# Altium schematic symbol library lib_datalogger.SchLib: 1246 symbols (part 15 of 16) (continued)
## CMP-023-000036-1 (continued)
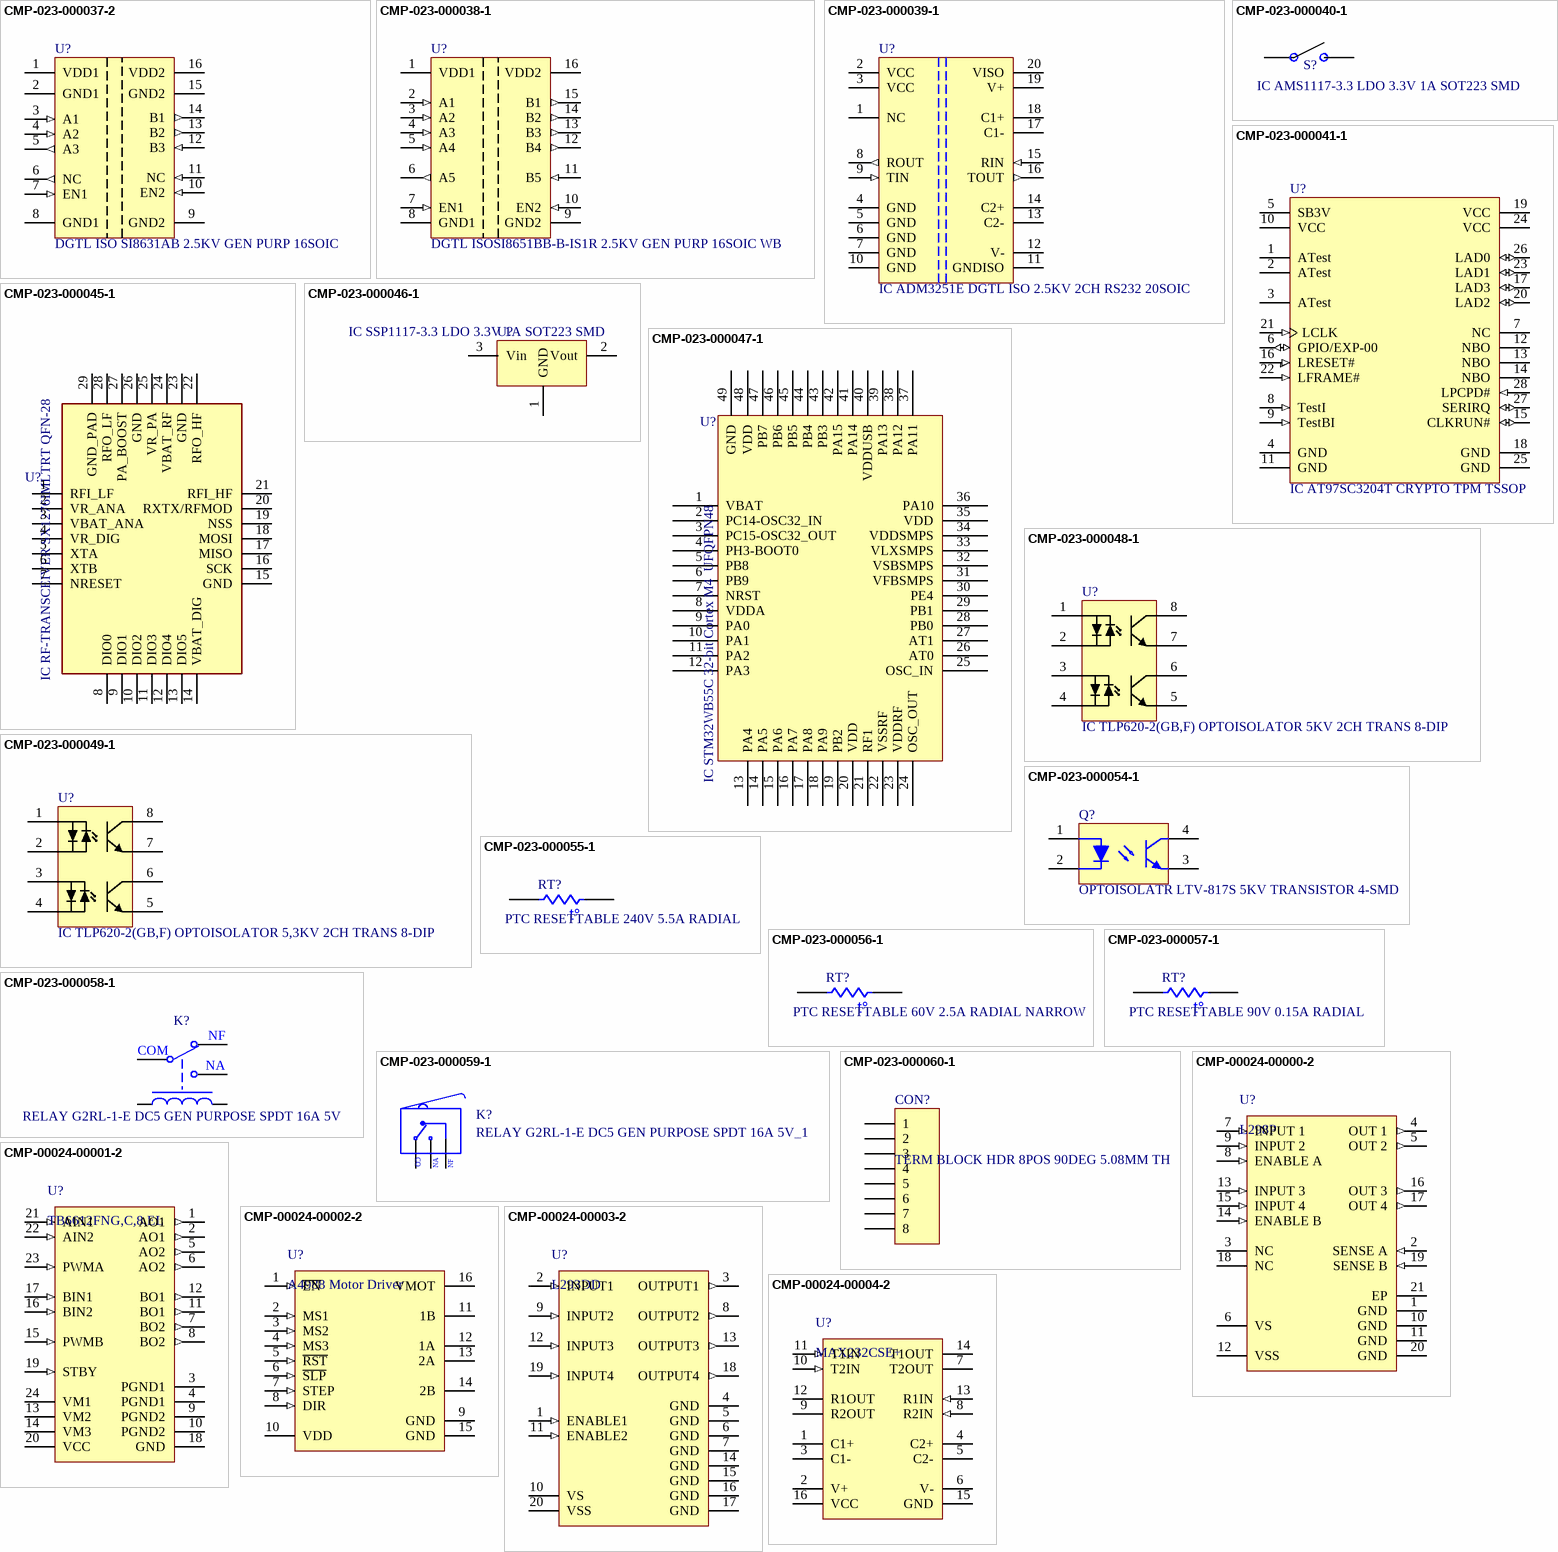
[diagram p42: symbols CMP-023-000037-2 to CMP-00024-00004-2]

## CMP-023-000037-2
designator U?, comment DGTL ISO SI8631AB 2.5KV GEN PURP 16SOIC
DGTL ISO 2.5KV GEN PURP 16SOIC; Manufacturer: Silicon Labs; Manufacturer Part Number: Si8631AB-B-ISR; Max Power Dissipation: 415mW; Number of Channels: 3; Max Supply Voltage: 5.5V; Turn-On Delay Time: 35ns; Min Supply Voltage: 2.5V; Data Rate: 1Mbps; Channel Type: Unidirectional; Operating Supply Current: 2.7mA; Isolated Power: No; Pulse Width Distortion (PWD): 25ns; ComponentLink3URL: https://datasheet.ciiva.com/29659/si86xx-29659215.pdf?src-supplier=Digi-Key; Stock 2: 2970; Min Operating Temperature: -40°C; Source: mits.SchLib; RoHS: Yes; ComponentLink2URL: https://datasheet.ciiva.com/29891/si86xx-29891862.pdf?src-supplier=Avnet; ComponentLink2Description: https://datasheet.ciiva.com/29891/si86xx-29891862.pdf?src-supplier=Avnet; Number of Pins: 16; Stock 1: 2970; ComponentLink1URL: http://www.analog.com/media/en/technical-documentation/data-sheets/ADuM160N-161N-162N-163N.pdf; Category: Integrated Circuits (ICs); ComponentLink4URL: https://datasheet.ciiva.com/29891/si86xx-29891863.pdf?src-supplier=Avnet; Pricing 1: 1=1,49000, 25=1,43360, 100=1,37860 (USD); ComponentLink1Description: http://www.analog.com/media/en/technical-documentation/data-sheets/ADuM160N-161N-162N-163N.pdf; ComponentLink4Description: https://datasheet.ciiva.com/29891/si86xx-29891863.pdf?src-supplier=Avnet; Pricing 2: 1=1,49000, 25=1,43360, 100=1,37860 (USD); Packaging: Tape and Reel; Case/Package: SOIC; Propagation Delay: 35ns; ComponentLink3Description: https://datasheet.ciiva.com/29659/si86xx-29659215.pdf?src-supplier=Digi-Key; Package Quantity: 2500; Max Operating Temperature: 125°C; Type: General Purpose; Design Item ID: DGTL ISO SI8631AB 2.5KV GEN PURP 16SOIC
footprint 16-SOIC(W)
footprint 16-SOIC(W)
pins: 1 VDD1 (power), 2 GND1 (power), 3 A1 (in), 4 A2 (in), 5 A3 (out), 6 NC (out), 7 EN1 (in), 8 GND1 (power), 9 GND2 (power), 10 EN2 (in), 11 NC (in), 12 B3 (in), 13 B2 (out), 14 B1 (out), 15 GND2 (power), 16 VDD2 (power)

## CMP-023-000038-1
designator U?, comment DGTL ISOSI8651BB-B-IS1R 2.5KV GEN PURP 16SOIC WB
Manufacturer: Silicon Labs; Manufacturer Part Number: SI8651BD-B-IS; Data Rate: 1Mbps; Max Power Dissipation: 415mW; Channel Type: Unidirectional; Number of Channels: 3; Propagation Delay: 35ns; Max Supply Voltage: 5.5V; Turn-On Delay Time: 10ns; Nominal Supply Current: 18.4mA; Isolated Power: No; Isolation Voltage: 3.75kV; Pulse Width Distortion (PWD): 25ns; Min Supply Voltage: 2.5V; Operating Supply Current: 2.7mA; Rise Time: 4ns; Max Input Current: 9.2mA; ComponentLink4Description: https://datasheet.ciiva.com/29891/si865x-29891900.pdf?src-supplier=Avnet; Package Quantity: 2500; REACH SVHC: Unknown; ComponentLink7URL: https://datasheet.ciiva.com/46410/1816592-46410007.pdf?src-supplier=Element14; Type: General Purpose; Max Operating Temperature: 125°C; ComponentLink2Description: https://datasheet.ciiva.com/29891/si86xx-29891862.pdf?src-supplier=Avnet; Number of Pins: 16; Length: 9.9mm; ComponentLink6URL: https://datasheet.ciiva.com/2082/supportdocuments2ftechnicaldocs2fsi865x-2082193.pdf?src-supplier=Digi-Key; ComponentLink5URL: https://datasheet.ciiva.com/15273/si865x-15273012.pdf?src-supplier=Arrow+Europe; ComponentLink6Description: https://datasheet.ciiva.com/2082/supportdocuments2ftechnicaldocs2fsi865x-2082193.pdf?src-supplier=Digi-Key; Weight: 0.001764oz; Min Operating Temperature: -40°C; ComponentLink1URL: http://www.analog.com/media/en/technical-documentation/data-sheets/ADuM160N-161N-162N-163N.pdf; ComponentLink2URL: https://datasheet.ciiva.com/29891/si86xx-29891862.pdf?src-supplier=Avnet; ComponentLink4URL: https://datasheet.ciiva.com/29891/si865x-29891900.pdf?src-supplier=Avnet; ComponentLink3URL: https://datasheet.ciiva.com/29659/si86xx-29659215.pdf?src-supplier=Digi-Key; Pricing 2: 1=2,45000, 25=2,36200, 100=2,27130, 1000=2,23742 (USD); Design Item ID: DGTL ISOSI8651BB-B-IS1R 2.5KV GEN PURP 16SOIC WB; Case/Package: SOIC; Source: mits.SchLib; Power Dissipation: 415mW; Packaging: Tape and Reel; Pricing 1: 1=2,45000, 25=2,36200, 100=2,27130, 1000=2,23742 (USD); Depth: 1.25mm; Width: 3.9mm; ComponentLink1Description: http://www.analog.com/media/en/technical-documentation/data-sheets/ADuM160N-161N-162N-163N.pdf; Category: Integrated Circuits (ICs); ComponentLink5Description: https://datasheet.ciiva.com/15273/si865x-15273012.pdf?src-supplier=Arrow+Europe; RoHS: Yes; Stock 2: 4459; Stock 1: 4459; ComponentLink7Description: https://datasheet.ciiva.com/46410/1816592-46410007.pdf?src-supplier=Element14; ComponentLink3Description: https://datasheet.ciiva.com/29659/si86xx-29659215.pdf?src-supplier=Digi-Key
footprint 16-SOIC(W)
footprint 16-SOIC(W)
pins: 1 VDD1 (power), 2 A1 (in), 3 A2 (in), 4 A3 (in), 5 A4 (in), 6 A5 (out), 7 EN1 (in), 8 GND1 (power), 9 GND2 (power), 10 EN2 (in), 11 B5 (in), 12 B4 (out), 13 B3 (out), 14 B2 (out), 15 B1 (out), 16 VDD2 (power)

## CMP-023-000039-1
designator U?, comment IC ADM3251E DGTL ISO 2.5KV 2CH RS232 20SOIC
DGTL ISO 2.5KV 2CH RS232 20SOIC; Part#: ADM3251EARWZ-REEL; Manufacturer: Analog Devices Inc.; MSRP: 4,636; eVendor: Digi-Key; eVendorPrice: 7,48; eVendor#: ADM3251EARWZ-REELCT-ND; MOQ: 500; Design Item ID: IC ADM3251E DGTL ISO 2.5KV 2CH RS232 20SOIC; Source: mits.SchLib; Datasheet: http://www.analog.com/media/en/technical-documentation/data-sheets/ADM3251E.pdf; Obs: -
footprint 20-SOIC WIDE
footprint 20-SOIC WIDE
pins: 1 NC "No Connect. This pin should always remain unconnected.", 2 VCC (power) "Power Supply Input. A 0.1 µF decoupling capacitor is required between VCC and ground. When a voltage", 3 VCC (power) "Power Supply Input. A 0.1 µF decoupling capacitor is required between VCC and ground. When a voltage", 4 GND (power) "Ground.", 5 GND (power) "Ground.", 6 GND (power) "Ground.", 7 GND (power) "Ground.", 8 ROUT (out) "Receiver Output. This pin outputs CMOS logic levels.", 9 TIN (in) "Transmitter (Driver) Input. This pin accepts CMOS levels.", 10 GND (power) "Ground.", 11 GNDISO (power) "Ground Reference for Isolated RS-232 Side.", 12 V- (power) "Internally Generated Negative Supply.", 13 C2- "Negative Connection for Charge Pump Capacitors. External Capacitor C2 is connected between  these pins; a 0.1 µF capacitor is recommended, but larger capacitors up to 10 µF can be used.", 14 C2+ "Positive Connection for Charge Pump Capacitors. External Capacitor C2 is connected between  these pins; a 0.1 µF capacitor is recommended, but larger capacitors up to 10 µF can be used.", 15 RIN (in) "Receiver Input. This input accepts RS-232 signal levels.", 16 TOUT (out) "Transmitter (Driver) Output. This outputs RS-232 signal levels.", 17 C1- "Negative Connection for Charge Pump Capacitors. External Capacitor C1 is connected between  these pins; a 0.1 µF capacitor is recommended, but larger capacitors up to 10 µF can be used.", 18 C1+ "Positive Connection for Charge Pump Capacitors. External Capacitor C1 is connected between  these pins; a 0.1 µF capacitor is recommended, but larger capacitors up to 10 µF can be used.", 19 V+ (power) "Internally Generated Positive Supply.", 20 VISO (power) "Isolated Supply Voltage for Isolator Secondary Side. A 0.1 µF decoupling capacitor is required between VISO  and ground. When the integrated dc-to-dc converter is enabled, the VISO pin should not be used to power  external circuitry. If the integrated dc-to-dc converter is disabled, power the secondary side by applying a  voltage in the range of 3.0 V to 5.5 V to this pin."

## CMP-023-000040-1
designator S?, comment IC AMS1117-3.3 LDO 3.3V 1A SOT223 SMD
FIXED 30V 3.3V 1.4V 1A SOT-223 DROPOUT REGULATORS(LDO) ROHS; Manufacturer 1: Slkor(SLKORMICRO Elec.); Polarity: Positive; Min Input Voltage: 3.8V; Number of Outputs: 1; ComponentLink1Description: https://datasheet.lcsc.com/szlcsc/1912111437_Slkor-SLKORMICRO-Elec-AMS1117-3-3_C426566.pdf; Category: Voltage Regulators - Linear; Max Input Voltage: 30V; Output Current: 1A; Max Output Voltage: 3.3V; Design Item ID: IC AMS1117-3.3 LDO 3.3V 1A SOT223 SMD; Max Output Current: 1A; Min Output Voltage: 3.3V; Case/Package: SOT-223; Number of Pins: 4; Manufacturer Part Number 1: AMS1117-3.3; Min Operating Temperature: 0°C; Packaging: Cut Tape; Output Voltage: 3.3V; RoHS: Yes; Radiation Hardening: No; ComponentLink1URL: https://datasheet.lcsc.com/szlcsc/1912111437_Slkor-SLKORMICRO-Elec-AMS1117-3-3_C426566.pdf; Max Operating Temperature: 125°C; Nominal Output Voltage: 3.3V; Output Type: Fixed; Source: mits.SchLib
footprint SWITCH_TOGGLE_TH
footprint SOT-223
pins: 1, 2

## CMP-023-000041-1
designator U?, comment IC AT97SC3204T CRYPTO TPM TSSOP
Fully Integrated Security Module; Manufacturer Part Number: AT97SC3204T-X2A1B-10; Manufacturer: Microchip / Atmel; Max Frequency: 33MHz; Memory Type: EEPROM; Core Architecture: AVR; Data Bus Width: 8b; Min Supply Voltage: 3V; Interface: I2C,Serial,2-Wire; Max Supply Voltage: 3.6V; Max Operating Temperature: 70°C; Series: CryptoController™; Package Quantity: 50; Case/Package: TSSOP; RoHS Compliant: Yes; Min Operating Temperature: 0°C; Mount: Surface Mount; ComponentLink1Description: https://datasheet.ciiva.com/29646/atmel-5295s-tpm-at97sc3204-lpc-interface-datasheet-summary-29646965.pdf?src-supplier=Digi-Key; Number of Pins: 28; Packaging: Rail/Tube; Category: Microcontrollers; Source: mits.SchLib; Design Item ID: IC AT97SC3204T CRYPTO TPM TSSOP; RoHS: Yes; ComponentLink1URL: https://datasheet.ciiva.com/29646/atmel-5295s-tpm-at97sc3204-lpc-interface-datasheet-summary-29646965.pdf?src-supplier=Digi-Key; Lead Free: Lead Free; Radiation Hardening: No
footprint 28-TSSOP
footprint 28-TSSOP
pins: 1 ATest "Atmel Teste Pin", 2 ATest "Atmel Teste Pin", 3 ATest "Atmel Teste Pin", 4 GND (power) "System Ground", 5 SB3V (power) "Standby 3.3v Supply", 6 GPIO/EXP-00 (io) "GPIO assigned to TPM_NV_INDEX_GPIO_00", 7 NC "No Connect Pins", 8 TestI (in) "Test Input", 9 TestBI (in) "Test Input", 10 VCC (power) "Power Supply, 3.3V", 11 GND (power) "System Ground", 12 NBO "Not Bounded Out", 13 NBO "Not Bounded Out", 14 NBO "Not Bounded Out", 15 CLKRUN# (io) "PCI Clock Run Input/Output", 16 LRESET# (in) "PCI Reset Input Active Low", 17 LAD3 (io) "LPC Command, Address, Data Line Input/Output", 18 GND (power) "System Ground", 19 VCC (power) "Power Supply, 3.3V", 20 LAD2 (io) "LPC Command, Address, Data Line Input/Output", 21 LCLK (in) "33MHz PCI Clock Input", 22 LFRAME# (in) "LPC FRAME Input", 23 LAD1 (io) "LPC Command, Address, Data Line Input/Output", 24 VCC (power) "Power Supply, 3.3V", 25 GND (power) "System Ground", 26 LAD0 (io) "LPC Command, Address, Data Line Input/Output", 27 SERIRQ (io) "Serialized Interrupt Request Input/Output", 28 LPCPD# (in) "LPC Power-Down Input"

## CMP-023-000045-1
designator U?, comment IC RF-TRANSCEIVER SX1276IMLTRT QFN-28
RF ISM Transceiver FSK/GFSK/GMSK/MSK/OOK 3.3V Automotive 28-Pin QFN EP T/R; Manufacturer: Semtech; Number of GPIO: 6; Current - Transmitting: 120mA; Sensitivity: -148dBm; Current - Receiving: 12mA; Frequency: 137MHz; Interface: SPI; Operating Supply Voltage: 3.7V; Data Rate: 300Kbps; ComponentLink3Description: https://datasheet.ciiva.com/29635/sx1276-29635607.pdf?src-supplier=Digi-Key; ComponentLink1Description: https://datasheet.ciiva.com/29635/sx1276-29635605.pdf?src-supplier=Digi-Key; Manufacturer_Part_Number: SX1276IMLTRT; Case/Package: VQFN; Stock 1: 7224; Max Operating Temperature: 85°C; ComponentLink3URL: https://datasheet.ciiva.com/29635/sx1276-29635607.pdf?src-supplier=Digi-Key; Mouser Part Number: 947-SX1276IMLTRT; Packaging: Tape and Reel; Arrow Part Number: SX1276IMLTRT; ComponentLink2URL: https://datasheet.ciiva.com/29635/sx1276-29635606.pdf?src-supplier=Digi-Key; Arrow Price/Stock: https://www.arrow.com/en/products/sx1276imltrt/semtech; ComponentLink1URL: https://datasheet.ciiva.com/29635/sx1276-29635605.pdf?src-supplier=Digi-Key; Source: mits.SchLib; Design Item ID: IC RF-TRANSCEIVER SX1276IMLTRT QFN-28; ComponentLink2Description: https://datasheet.ciiva.com/29635/sx1276-29635606.pdf?src-supplier=Digi-Key; Package Quantity: 3000; Datasheet Link: https://componentsearchengine.com/Datasheets/1/SX1276IMLTRT.pdf; Mouser Price/Stock: https://www.mouser.co.uk/ProductDetail/Semtech/SX1276IMLTRT/?qs=rBWM4%252BvDhIceYQoeMKd%2FQQ%3D%3D; Manufacturer Part Number: SX1276IMLTRT; Category: RF Receivers, Transceivers; Pricing 1: 1=5,41340, 10=4,73400, 30=4,61150, 100=4,48640, 500=4,42980, 1000=4,36140, 1=5,21090, 10=4,55690, 30=4,43890, 100=4,31860, 500=4,26400, 1000=4,19820, 1=27,19180, 10=23,77920, 30=23,16360, 100=22,53550, 500=22,25100, 1000=21,90740, 1=26,13980, 10=22,85920, 30=22,26740, 100=21,66360, 500=21,39010, 1000=21,05980, 1=3,51510, 10=3,07390, 30=2,99430, 100=2,91320, 500=2,87640, 1000=2,83200, 1=3,00480, 10=2,62770, 30=2,55970, 100=2,49030, 500=2,45880, 1000=2,42090, 1=32,17180, 10=28,13420, 30=27,40580, 100=26,66270, 500=26,32610, 1000=25,91950, 1=454,68930, 10=397,62520, 30=387,33080, 100=376,82760, 500=372,07050, 1000=366,32450, 1=17,15020, 10=14,99780, 30=14,60950, 100=14,21340, 500=14,03390, 1000=13,81720, 1=313,08710, 10=273,79430, 30=266,70580, 100=259,47360, 500=256,19790, 1000=252,24140, 1=35,94210, 10=31,43130, 30=30,61760, 100=29,78730, 500=29,41130, 1000=28,95710, 1=5,57920, 10=4,87900, 30=4,75270, 100=4,62380, 500=4,56550, 1000=4,49500, 1=4,13860, 10=3,61920, 30=3,52550, 100=3,42990, 500=3,38660, 1000=3,33430 (AUD); Height: 1mm; Min Operating Temperature: -40°C; RoHS: Yes; Lead Free: Lead Free; Manufacturer_Name: SEMTECH
footprint QFN65P600X600X100-29N
footprint QFN65P600X600X100-29N
pins: 1 RFI_LF, 2 VR_ANA, 3 VBAT_ANA, 4 VR_DIG, 5 XTA, 6 XTB, 7 NRESET, 8 DIO0, 9 DIO1, 10 DIO2, 11 DIO3, 12 DIO4, 13 DIO5, 14 VBAT_DIG, 15 GND, 16 SCK, 17 MISO, 18 MOSI, 19 NSS, 20 RXTX/RFMOD, 21 RFI_HF, 22 RFO_HF, 23 GND, 24 VBAT_RF, 25 VR_PA, 26 GND, 27 PA_BOOST, 28 RFO_LF, 29 GND_PAD

## CMP-023-000046-1
designator U?, comment IC SSP1117-3.3 LDO 3.3V 1A SOT223 SMD
FIXED 20V 3.3V 1.5V 1A SOT-223 DROPOUT REGULATORS(LDO) ROHS; Manufacturer 1: Shanghai Siproin Microelectronics; Manufacturer Part Number 1: SSP1117-3.3V; Polarity: Positive; Number of Outputs: 1; ComponentLink1URL: https://datasheet.lcsc.com/szlcsc/1811111806_Shanghai-Siproin-Microelectronics-SSP1117-3-3V_C277892.pdf; Max Output Current: 1A; Category: Voltage Regulators - Linear; Design Item ID: IC SSP1117-3.3 LDO 3.3V 1A SOT223 SMD; Radiation Hardening: No; Packaging: Cut Tape; Nominal Output Voltage: 3.3V; Output Voltage: 3.3V; Min Output Voltage: 3.3V; Max Operating Temperature: 125°C; Output Current: 1A; RoHS: Yes; Source: mits.SchLib; Number of Pins: 4; ComponentLink1Description: https://datasheet.lcsc.com/szlcsc/1811111806_Shanghai-Siproin-Microelectronics-SSP1117-3-3V_C277892.pdf; Case/Package: SOT-223; Min Operating Temperature: -20°C; Max Input Voltage: 20V; Max Output Voltage: 3.3V; Output Type: Fixed
footprint SOT-223
footprint SOT-223
pins: 1 GND, 2 Vout, 3 Vin

## CMP-023-000047-1
designator U?, comment IC STM32WB55C 32-bit Cortex M4  UFQFPN48
Manufacturer Part Number: STM32WB55CGU6U; Manufacurer: STMicroelectronics; Design Item ID: IC STM32WB55C 32-bit Cortex M4  UFQFPN48; Component: STM32WB55; Source: mits.SchLib; Supplier Device Package: UFQFPN-48; Mounting Type: Surface Mount
footprint UFQFPN48
footprint UFQFPN48
pins: 1 VBAT (power), 2 PC14-OSC32_IN, 3 PC15-OSC32_OUT, 4 PH3-BOOT0, 5 PB8, 6 PB9, 7 NRST, 8 VDDA, 9 PA0, 10 PA1, 11 PA2, 12 PA3, 13 PA4, 14 PA5, 15 PA6, 16 PA7, 17 PA8, 18 PA9, 19 PB2, 20 VDD, 21 RF1, 22 VSSRF, 23 VDDRF, 24 OSC_OUT, 25 OSC_IN, 26 AT0, 27 AT1, 28 PB0, 29 PB1, 30 PE4, 31 VFBSMPS, 32 VSBSMPS, 33 VLXSMPS, 34 VDDSMPS, 35 VDD, 36 PA10, 37 PA11, 38 PA12, 39 PA13, 40 VDDUSB, 41 PA14, 42 PA15, 43 PB3, 44 PB4, 45 PB5, 46 PB6, 47 PB7, 48 VDD, 49 GND

## CMP-023-000048-1
designator U?, comment IC TLP620-2(GB,F) OPTOISOLATOR 5KV 2CH TRANS 8-DIP
OPTOISOLATOR 5KV 2CH TRANS 8-DIP; Manufacturer: Toshiba Semiconductor and Storage; Voltage - Isolation: 5000Vrms; Input Type: AC, DC; Current - Output / Channel: 50mA; Voltage - Forward (Vf) (Typ): 1.15V; Output Type: Transistor; Number of Channels: 2; Current Transfer Ratio (Max): 600% @ 5mA; Current Transfer Ratio (Min): 100% @ 5mA; Voltage - Output (Max): 55V; Rise / Fall Time (Typ): 2µs, 3µs; Vce Saturation (Max): 400mV; Turn On / Turn Off Time (Typ): 3µs, 3µs; ComponentLink1URL: http://toshiba.semicon-storage.com/info/docget.jsp?did=16776&prodName=TLP620; Package / Case: 8-DIP (0.300", 7.62mm); ComponentLink1Description: http://toshiba.semicon-storage.com/info/docget.jsp?did=16776&prodName=TLP620; Operating Temperature: -55°C ~ 100°C; Packaging: Tube; Mounting Type: Through Hole; Current - DC Forward (If) (Max): 50mA; Stock 1: 544; Design Item ID: IC TLP620-2(GB,F) OPTOISOLATOR 5KV 2CH TRANS 8-DIP; Manufacturer Part Number: TLP620-2(GB,F); Category: Isolators; Source: mits.SchLib; Supplier Device Package: 8-DIP; Pricing 1: 1=1.8, 10=1.463, 25=1.1252, 100=1.0125, 250=0.9, 500=0.765 (USD); RoHS: RoHS Compliant
footprint 8-SMD
footprint DIP-8_SOCKET (DIP; 8 Leads; Row Spacing 7.62 mm; Pitch 2.54 mm)
pins: 1, 2, 3, 4, 5, 6, 7, 8

## CMP-023-000049-1
designator U?, comment IC TLP620-2(GB,F) OPTOISOLATOR 5,3KV 2CH TRANS 8-DIP
OPTOISO 5.3KV 2CH TRANS 8SMD; Manufacturer: Vishay Semiconductors; Manufacturer Part Number: ILD620-X009T; Max Collector Current: 100mA; Forward Current: 60mA; Current Transfer Ratio: 600%; Power Dissipation: 400mW; Output Current per Channel: 50mA; Max Output Voltage: 70V; Collector Emitter Saturation Voltage: 400mV; Forward Voltage: 1.15V; Number of Elements: 2; Source: mits.SchLib; Mount: Surface Mount; Max Input Current: 60mA; ComponentLink1URL: https://datasheet.ciiva.com/8091/ild620-8091958.pdf?src-supplier=Avnet; ComponentLink1Description: https://datasheet.ciiva.com/8091/ild620-8091958.pdf?src-supplier=Avnet; ComponentLink2URL: https://datasheet.ciiva.com/18615/options-18615786.pdf?src-supplier=Digi-Key; Radiation Hardening: No; Stock 1: 1763; Category: Optocouplers; ComponentLink2Description: https://datasheet.ciiva.com/18615/options-18615786.pdf?src-supplier=Digi-Key; Packaging: Tape and Reel; Case/Package: SMD/SMT; Pricing 1: 1=2,47000, 10=2,18600, 100=1,26900, 500=1,12800 (USD); RoHS: Yes; Max Operating Temperature: 100°C; Package Quantity: 1000; Design Item ID: IC TLP620-2(GB,F) OPTOISOLATOR 5,3KV 2CH TRANS 8-DIP; Number of Pins: 8; Collector Emitter Voltage (VCEO): 70V; Min Operating Temperature: -55°C; Number of Channels: 2; Max Power Dissipation: 400mW
footprint 8-SMD
footprint 8-SMD
pins: 1, 2, 3, 4, 5, 6, 7, 8

## CMP-023-000054-1
designator Q?, comment OPTOISOLATR LTV-817S 5KV TRANSISTOR 4-SMD
OPTOISOLATR 5KV TRANSISTOR 4-SMD; Manufacturer: Lite-On Inc.; Number of Channels: 1; Voltage - Forward (Vf) (Typ): 1.2V; Rise / Fall Time (Typ): 4µs, 3µs; Current Transfer Ratio (Min): 50% @ 5mA; Voltage - Output (Max): 35V; Input Type: DC; Current - Output / Channel: 50mA; Current Transfer Ratio (Max): 600% @ 5mA; Voltage - Isolation: 5000Vrms; Vce Saturation (Max): 200mV; ComponentLink1Description: http://optoelectronics.liteon.com/upload/download/DS70-2012-0050/S_110_LTV-817%20(M,%20S,%20S-TA,%20S-TA1,%20S-TP)%20Series%2020130925.pdf; Design Item ID: OPTOISOLATR LTV-817S 5KV TRANSISTOR 4-SMD; Source: mits.SchLib; Turn On / Turn Off Time (Typ): -; ComponentLink1URL: http://optoelectronics.liteon.com/upload/download/DS70-2012-0050/S_110_LTV-817%20(M,%20S,%20S-TA,%20S-TA1,%20S-TP)%20Series%2020130925.pdf; Manufacturer Part Number: LTV-817S; Stock 1: 43203; Supplier Device Package: 4-SMD; RoHS: RoHS Compliant; Category: Isolators; Mounting Type: Surface Mount; Packaging: Tube; Pricing 1: 1=0.45, 10=0.326, 25=0.266, 100=0.2128, 250=0.17956, 500=0.15296, 1000=0.1197, 2500=0.10972, 5000=0.09975 (USD); Operating Temperature: -30°C ~ 110°C; Current - DC Forward (If) (Max): 50mA; Output Type: Transistor; Package / Case: 4-SMD, Gull Wing
footprint 4-SMD_Gull_Wing
footprint 4-SMD_Gull_Wing
pins: 1 A, 2 K, 3 E, 4 C

## CMP-023-000055-1
designator RT?, comment PTC RESETTABLE 240V 5.5A RADIAL
PTC RESET FUSE 240V 400MA RADIAL; Manufacturer Part Number: RF0003-000; Manufacturer: Littelfuse; Time to Trip: 24s; Trip Current: 900mA; Length: 0.453inch; ComponentLink1URL: http://www.littelfuse.com/~/media/electronics/datasheets/resettable_ptcs/littelfuse_ptc_lvr_catalog_datasheet.pdf.pdf?src-supplier=Digi-Key; Stock 1: 2706; Lead Pitch: 0.199inch; Case/Package: Radial; Width: 0.15inch; ComponentLink2URL: http://www.te.com/commerce/DocumentDelivery/DDEController?Action=srchrtrv&DocNm=SCD25018&DocType=SS&DocLang=EN&src-supplier=Digi-Key; RoHS: Yes; Mount: Through Hole; Category: PTC Resettable Fuses; Pricing 1: 1=0,92000, 5=0,88600, 10=0,82900, 50=0,68640, 100=0,57200, 250=0,55772, 500=0,47190, 1000=0,41470 (USD); Hold Current: 400mA; Design Item ID: PTC RESETTABLE 240V 5.5A RADIAL; Max Current Rating: 5.5A; Height - Seated (Max): 0.82inch; ComponentLink2Description: http://www.te.com/commerce/DocumentDelivery/DDEController?Action=srchrtrv&DocNm=SCD25018&DocType=SS&DocLang=EN&src-supplier=Digi-Key; ComponentLink1Description: http://www.littelfuse.com/~/media/electronics/datasheets/resettable_ptcs/littelfuse_ptc_lvr_catalog_datasheet.pdf.pdf?src-supplier=Digi-Key; Source: mits.SchLib; Packaging: Tape and Reel
footprint PTC_TH (Jumper Wire; 2 Leads)
footprint PTC_TH (Jumper Wire; 2 Leads)
pins: 1, 2
text: t°

## CMP-023-000056-1
designator RT?, comment PTC RESETTABLE 60V 2.5A RADIAL NARROW
PTC Resettable Fuse 2.5A 5A 60VRadial 14 X 20.6mm; Manufacturer Part Number: 0ZRP0250FF1A; Manufacturer: Bel; Approvals: UL,cURus; Max Current Rating: 40A; Time to Trip: 15.6s; Design Item ID: PTC RESETTABLE 60V 2.5A RADIAL NARROW; Mount: Through Hole; Stock 1: 1334; RoHS: No; Max Operating Temperature: 85°C; Min Operating Temperature: -40°C; Hold Current: 2.5A; Source: mits.SchLib; Category: PTC Resettable Fuses; Case/Package: Radial; Trip Current: 5A; ComponentLink1Description: https://media.digikey.com/pdf/Data%20Sheets/Bel%20Fuse%20PDFs/0ZRP_Series.pdf?src-supplier=Digi-Key; Pricing 1: 1=0,52000, 5=0,50000, 10=0,48500, 50=0,40820, 100=0,33880, 250=0,30800, 500=0,26180, 1000=0,23100, 5000=0,20790 (USD); ComponentLink1URL: https://media.digikey.com/pdf/Data%20Sheets/Bel%20Fuse%20PDFs/0ZRP_Series.pdf?src-supplier=Digi-Key
footprint PTC_TH (Jumper Wire; 2 Leads)
footprint PTC_TH 5.1%2F10.2 A14 (Jumper Wire; 2 Leads)
pins: 1, 2
text: t°

## CMP-023-000057-1
designator RT?, comment PTC RESETTABLE 90V 0.15A RADIAL
Manufacturer Part Number: 0ZRC0015FF1E; Manufacturer: Bel Fuse Inc.; Current - Hold (Ih) (Max): 150mA; Current - Max: 40A; Time to Trip: 3s; R Min/Max: 2.400 ~ 5.500 Ohm; Current - Trip (It): 350mA; Design Item ID: PTC RESETTABLE 90V 0.15A RADIAL; Thickness (Max): -; Voltage - Max: 90V; Source: mits.SchLib; Pricing 1: 1=0.21, 5=0.206, 10=0.197, 50=0.1754, 100=0.1634, 250=0.1452, 500=0.121, 1000=0.11495, 5000=0.09075 (USD); Mounting Type: Through Hole; Package / Case: Radial, Disc; RoHS: RoHS Compliant; Size / Dimension: 0.291" L x 0.122" W (7.40mm x 3.10mm); ComponentLink1URL: http://belfuse.com/pdfs/0ZRC.pdf; ComponentLink1Description: http://belfuse.com/pdfs/0ZRC.pdf; Category: Circuit Protection; Stock 1: 2900; Part Status: Active; Lead Spacing: 0.201" (5.10mm); Packaging: Bulk; Height - Seated (Max): 0.500" (12.70mm)
footprint PTC_TH (Jumper Wire; 2 Leads)
footprint PTC_TH (Jumper Wire; 2 Leads)
pins: 1, 2
text: t°

## CMP-023-000058-1
designator K?, comment RELAY G2RL-1-E DC5 GEN PURPOSE SPDT 16A 5V
RELAY GEN PURPOSE SPDT 16A 5V; Manufacturer: Omron Electronics Inc-EMC Div; Release Time: 5ms; Turn Off Voltage (Min): 0.5 VDC; Contact Form: SPDT (1 Form C); Relay Type: General Purpose; Coil Power: 400 mW; Coil Resistance: 62.5 Ohms; Switching Voltage: 440VAC, 300VDC - Max; Coil Voltage: 5VDC; Operate Time: 15ms; Coil Type: Non Latching; Coil Current: 80mA; Turn On Voltage (Max): 3.5 VDC; ComponentLink1Description: http://www.omron.com/ecb/products/pdf/en-g2rl.pdf; Design Item ID: RELAY G2RL-1-E DC5 GEN PURPOSE SPDT 16A 5V; Termination Style: PC Pin; Contact Material: Silver Alloy, Cadmium Free; Pricing 1: 1=3.07, 10=2.879, 25=2.5596, 50=2.4314, 100=2.3035, 250=2.04752, 500=1.91956, 1000=1.79158, 2500=1.75959 (USD); Source: mits.SchLib; Packaging: Tube; ComponentLink1URL: http://www.omron.com/ecb/products/pdf/en-g2rl.pdf; Category: Relays; Contact Rating (Current): 16A; RoHS: RoHS Compliant; Features: Insulation - Class B, Sealed - Flux Protection; Mounting Type: Through Hole; Operating Temperature: -40°C ~ 85°C; Manufacturer Part Number: G2RL-1-E DC5; Stock 1: 3530
pins: 1, 2 NF, 3 COMUM, 4 NA, 5 NA, 6 COMUM, 7 NF, 8
text: COM

## CMP-023-000059-1
designator K?, comment RELAY G2RL-1-E DC5 GEN PURPOSE SPDT 16A 5V_1
Manufacturer: Omron Electronics Inc-EMC Div; Operate Time: 15ms; Coil Resistance: 62.5 Ohms; Switching Voltage: 440VAC, 300VDC - Max; Coil Voltage: 5VDC; Relay Type: General Purpose; Release Time: 5ms; Turn On Voltage (Max): 3.5 VDC; Contact Form: SPDT (1 Form C); Coil Current: 80mA; Coil Type: Non Latching; Turn Off Voltage (Min): 0.5 VDC; Coil Power: 400 mW; Stock 1: 3530; Design Item ID: RELAY G2RL-1-E DC5 GEN PURPOSE SPDT 16A 5V_1; Mounting Type: Through Hole; Features: Insulation - Class B, Sealed - Flux Protection; Contact Rating (Current): 16A; Contact Material: Silver Alloy, Cadmium Free; Source: mits.SchLib; ComponentLink1URL: http://www.omron.com/ecb/products/pdf/en-g2rl.pdf; Pricing 1: 1=3.07, 10=2.879, 25=2.5596, 50=2.4314, 100=2.3035, 250=2.04752, 500=1.91956, 1000=1.79158, 2500=1.75959 (USD); RoHS: RoHS Compliant; Packaging: Tube; ComponentLink1Description: http://www.omron.com/ecb/products/pdf/en-g2rl.pdf; Operating Temperature: -40°C ~ 85°C; Category: Relays; Manufacturer Part Number: G2RL-1-E DC5; Termination Style: PC Pin
pins: 2 NF, 5 NA, 6 COMUM
text: CO

## CMP-023-000060-1
designator CON?, comment TERM BLOCK HDR 8POS 90DEG 5.08MM TH
TERM BLOCK HDR 8POS 90DEG 5.08MM; Manufacturer: Molex Connector Corporation; Manufacturer Part Number: 39532-1006; Pitch: 0.200" (5.08mm); Number of Circuits: 6; Gender: Male; Header Orientation: 90°, Right Angle; Contact Tail Length: 0.150" (3.81mm); Connector Type: Terminal Block; Current: 15A; Material Flammability Rating: UL94 V-0; Voltage: 300V; Number of Levels: 1; Max Voltage Rating (DC): 300.3kV; Mount: Through Hole; Part Status: Active; Voltage - IEC: -; REACH SVHC: No SVHC; ComponentLink1URL: http://www.molex.com/pdm_docs/sd/395321002_sd.pdf; Width: 12mm; ComponentLink9Description: https://datasheet.ciiva.com/15208/getdatasheetpartid-198942-15208053.pdf?src-supplier=Verical; Number of Rows: 1; ComponentLink10URL: https://datasheet.ciiva.com/10143/20020110-10143531.pdf?src-supplier=Avnet; ComponentLink7Description: https://datasheet.ciiva.com/16725/20020110-16725276.pdf?src-supplier=Avnet+Europe; ComponentLink3URL: https://datasheet.ciiva.com/7978/1480852-7978999.pdf?src-supplier=Element14; ComponentLink10Description: https://datasheet.ciiva.com/10143/20020110-10143531.pdf?src-supplier=Avnet; Housing Material: Polyamide (PA66), Nylon 6/6; Stock 2: 3509; Design Item ID: TERM BLOCK HDR 8POS 90DEG 5.08MM TH; Lead Free: Lead Free; Radiation Hardening: No; ComponentLink6URL: https://datasheet.ciiva.com/22625/1577242-22625147.pdf?src-supplier=Element14; Number of Positions Per Level: 6; ComponentLink8URL: https://datasheet.ciiva.com/795/20020110-795840.pdf?src-supplier=Digi-Key; RoHS: RoHS Compliant; ComponentLink8Description: https://datasheet.ciiva.com/795/20020110-795840.pdf?src-supplier=Digi-Key; Package Quantity: 1; Depth: 12mm; Features: -; Pricing 1: 190=0,38419 (USD); Insulation Height: 0.472" (12.00mm); Housing Color: Black; ComponentLink3Description: https://datasheet.ciiva.com/7978/1480852-7978999.pdf?src-supplier=Element14; Contact Plating: Tin; Wire Gauge or Range - AWG: -; Plug Wire Entry: -; Termination: Solder; Length: 32.5mm; Torque - Screw: -; ComponentLink2Description: https://datasheet.ciiva.com/5190/0395321006-terminal-blocks-166209-5190898.pdf?src-supplier=Mouser; ComponentLink9URL: https://datasheet.ciiva.com/15208/getdatasheetpartid-198942-15208053.pdf?src-supplier=Verical; Operating Temperature: -40°C ~ 105°C; Contact Mating Finish: Tin; Number of Positions: 6; ComponentLink1Description: http://www.molex.com/pdm_docs/sd/395321002_sd.pdf; Current - IEC: -; Material: Nylon; Packaging: Bulk; Number of Contacts: 6; Flammability Rating: UL94 V-0; Mounting Type: Through Hole; ComponentLink7URL: https://datasheet.ciiva.com/16725/20020110-16725276.pdf?src-supplier=Avnet+Europe; ComponentLink4Description: https://datasheet.ciiva.com/810/395321002-sd-810100.pdf?src-supplier=Digi-Key; Ingress Protection: -; Wire Strip Length: -; ComponentLink5URL: https://datasheet.ciiva.com/11749/0900766b80e53f68-11749398.pdf?src-supplier=RSComponents; Color: Black; Current Rating: 15A; Current - UL: 15A; Termination Style: Solder; Pricing 2: 1=1,81000, 10=1,64100, 100=1,40670, 500=1,17228, 1000=1,00481, 5000=0,89093, 10000=0,87083 (USD); ComponentLink4URL: https://datasheet.ciiva.com/810/395321002-sd-810100.pdf?src-supplier=Digi-Key; Source: mits.SchLib; ELV: Compliant; Orientation: Right Angle; Category: Connectors, Interconnects; ComponentLink2URL: https://datasheet.ciiva.com/5190/0395321006-terminal-blocks-166209-5190898.pdf?src-supplier=Mouser; Stock 1: 242; Max Voltage Rating (AC): 300V; Wire Gauge or Range - mm²: -; Positions Per Level: 6; Voltage Rating: 300V; Type: Header, Male Pins, Shrouded (4 Side); ComponentLink5Description: https://datasheet.ciiva.com/11749/0900766b80e53f68-11749398.pdf?src-supplier=RSComponents; Contact Material: Brass; Screw Size: -; Min Operating Temperature: -40°C; Max Operating Temperature: 105°C; Voltage - UL: 300V; ComponentLink6Description: https://datasheet.ciiva.com/22625/1577242-22625147.pdf?src-supplier=Element14